# Altium footprint library 元件1.PcbLib: 420 footprints (part 15 of 27)
Each footprint in its own frame and in the unit in brackets; x right, y up, seen from the top. Pads: shape width x height; smd on the part's side, far side on the other; paste and mask are expansions set on the pad; w line width, h text height; cw(c..) or ccw(c..) is an arc to the next point about the centre after c.
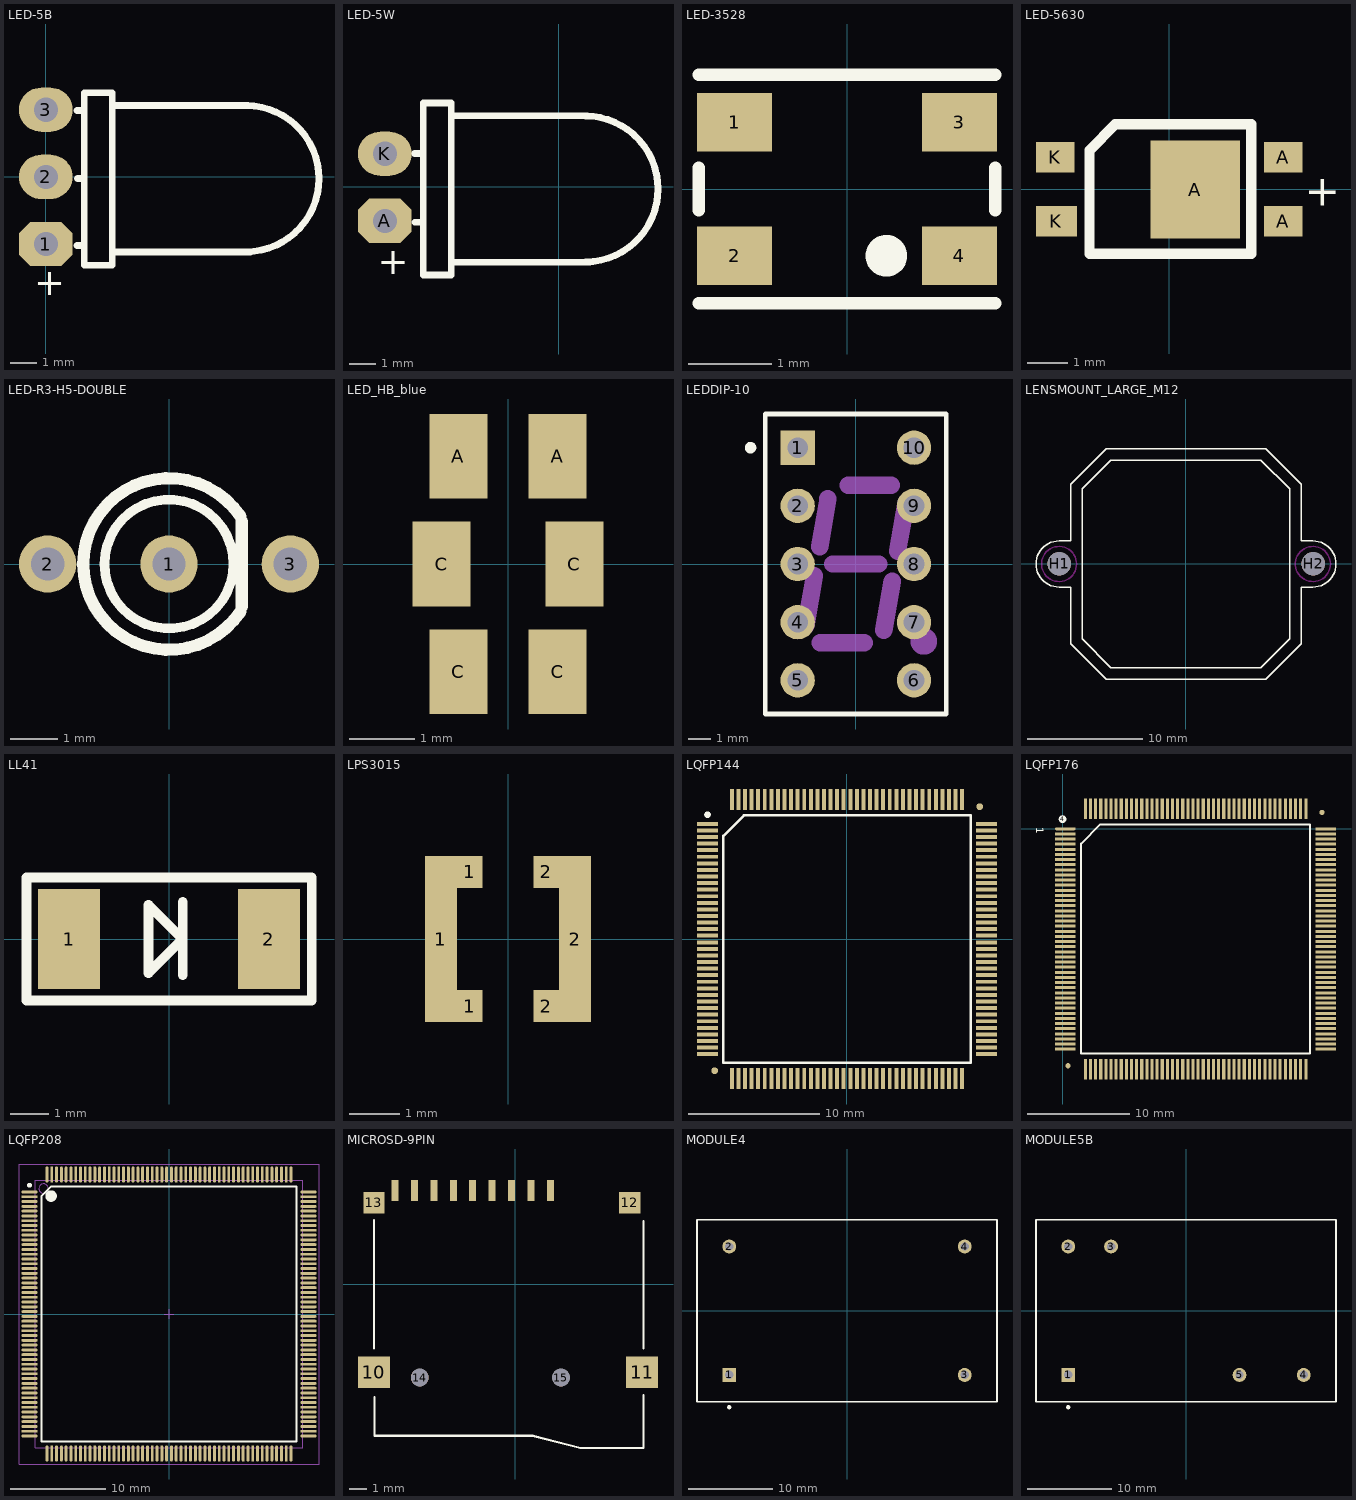
[diagram p14: the footprints below, top view; thin cyan lines are the x and y axes]

## LED-5B [mm]
pads (3):
  oct 2x1.651 hole 0.9 mask+0.03: 1(0,-2.502)
  oval 2x1.651 hole 0.9 mask+0.03: 2(0,0) 3(0,2.502)
Top Overlay:
  lines w0.254: 1.164,-2.551 1.393,-2.551 ; 1.164,2.478 1.393,2.478 ; 1.177,-0.062 1.406,-0.062 ; 2.472,-2.798 7.629,-2.798 ; 2.549,2.663 7.527,2.663 ; 7.477,-2.788 ccw(c7.454,-0.066) 7.476,2.656 ; 1.431,-3.294 2.472,-3.294 2.472,3.132 1.431,3.132 1.431,-3.294
  text "+" at -0.423,-4.405 h1
3D body "LED5-BW.STEP": height 0.87, standoff -7.2, extent -0.415,-3.115 11.108,2.884

## LED-5W [mm]
pads (2):
  oct 2x1.651 hole 0.9 mask+0.03: A(-6.486,-1.271)
  oval 2x1.651 hole 0.9 mask+0.03: K(-6.486,1.23)
Top Overlay:
  lines w0.254: -5.385,1.245 -5.055,1.245 ; -5.359,-1.321 -5.105,-1.321 ; -4.013,-2.813 1.143,-2.813 ; -3.937,2.648 1.041,2.648 ; 0.991,-2.802 ccw(c0.969,-0.08) 0.991,2.642 ; -5.055,-3.283 -4.013,-3.283 -4.013,3.117 -5.055,3.117 -5.055,-3.283
  text "+" at -6.756,-3.251 h1
3D body "LED5-H.STEP": height 6, standoff -2.07, extent -6.849,-3.073 4.674,2.927

## LED-3528 [mm]
pads (4):
  rect 0.9x0.7 smd: 1(-1.35,0.8) 2(-1.35,-0.8) 3(1.35,0.8) 4(1.35,-0.8)
Top Overlay:
  circle w0.25: c0.472,-0.802 r0.125
  lines w0.152: -1.778,-1.372 1.778,-1.372 ; -1.778,-0.254 -1.778,0.254 ; -1.778,1.372 1.778,1.372 ; 1.778,-0.254 1.778,0.254
3D body "LED-3528.STEP": height 1.95, standoff 0, extent -1.747,-1.379 1.754,1.371

## LED-5630 [mm]
pads (5):
  rect 2.2x2.4 smd: A(0.635,-0.006)
  rect 0.95x0.75 smd: A(2.794,-0.781) A(2.794,0.781) K(-2.794,0.781)
  rect 1x0.75 smd: K(-2.769,-0.781)
Top Overlay:
  lines w0.254: -1.956,-1.581 -1.956,0.959 -1.321,1.594 2.007,1.594 2.007,-1.581 -1.956,-1.581
  text "+" at 3.327,-0.4 h0.76
3D body "User Library-5630.step": height 0.95, standoff -0.01, extent -2.775,-1.457 2.826,1.543

## LED-R3-H5-DOUBLE [mm]
height 5
pads (3):
  round 1.2 hole 0.7: 1(0,0) 2(-2.54,0) 3(2.54,0)
Top Overlay:
  circle w0.2: c0,0 r1.35
  lines w0.254: 1.494,-0.996 cw(c0,0) 1.494,0.996 ; 1.524,-0.889 1.524,0.889
3D body "LED-DBL.STEP": height 5.7, standoff -2.3, extent -2.79,-2.035 2.79,2.035

## LED_HB_blue [mil] "LED High Brightness for blue"
pads (6):
  rect 35x51 smd: A(-30,65) A(30,65) C(-40,0) C(-30,-65) C(30,-65) C(40,0)
3D body "User Library-LED_ASMT-QTB0-0AA02.STEP": height 76.77, standoff -1.97, extent -67.32,-69.29 66.54,72.44

## LEDDIP-10 [mm] "LED, 7-Segment Display, 7.62 mm, RHD; 10 Leads; Row Space 5.08 mm; Pitch 2.54 mm"
height 6.34
pads (10):
  rect 1.5x1.5 hole 0.9: 1(-2.54,5.08)
  round 1.5 hole 0.9: 2(-2.54,2.54) 3(-2.54,0) 4(-2.54,-2.54) 5(-2.54,-5.08) 6(2.54,-5.08) 7(2.54,-2.54) 8(2.54,0) 9(2.54,2.54) 10(2.54,5.08)
Top Overlay:
  circle w0.25: c-4.6,5.08 r0.125
  lines w0.2: -3.95,-6.55 3.95,-6.55 3.95,6.55 -3.95,6.55 -3.95,-6.55
Mechanical 1:
  circle w0.86: c2.97,-3.38 r0.15
  lines w0.762: -2.19,-2.69 -1.81,-0.52 ; -1.58,0.76 -1.22,2.84 ; -1.56,-3.43 0.36,-3.43 ; -1.004,0 1.004,0 ; -0.34,3.43 1.55,3.43 ; 1.22,-2.89 1.59,-0.76 ; 1.82,0.56 2.2,2.69
3D body "LEDDIP-10.STEP": height 6, standoff 0, extent -4.025,-6.447 3.975,6.553

## LENSMOUNT_LARGE_M12 [mil]
pads (2):
  round 80 hole 80: H1(-432.68,0.39) H2(433.86,0.79)
Top Overlay:
  lines w5: -433.07,-78.74 cw(c-433.07,0) -433.07,78.74 -393.7,78.74 -393.7,271.66 -271.65,393.7 271.65,393.7 393.71,271.66 393.71,78.74 433.08,78.74 cw(c433.08,0) 433.08,-78.74 393.71,-78.74 393.71,-271.65 271.65,-393.7 -271.65,-393.7 -393.7,-271.65 -393.7,-78.74 -433.07,-78.74 ; -354.33,-255.91 -255.91,-354.33 255.91,-354.33 354.34,-255.91 354.34,255.91 255.91,354.33 -255.91,354.33 -354.33,255.91 -354.33,-255.91
Keep-Out Layer:
  circle w5: c433.07,0 r60
  circle w5: c-433.07,0 r60
3D body "LENS_MOUNT.STEP": height 511.81, standoff 0, extent -512.99,-395.28 518.5,392.13

## LL41 [mm] "DO-213AB/LL35"
pads (2):
  rect 1.6x2.6 smd: 1(-2.6,0) 2(2.6,0)
Top Overlay:
  lines w0.254: 0.356,-0.94 0.356,0.965 ; -3.708,-1.6 3.709,-1.6 3.709,1.6 -3.708,1.6 -3.708,-1.6 ; -0.533,-0.889 0.356,0 -0.533,0.889 -0.533,-0.889
3D body "MELF DO-213AB.step": height 2.67, standoff 0, extent -2.6,-1.332 2.6,1.332

## LPS3015 [mil] "INDUCTOR 2.2UH"
pads (6):
  rect 25x130 smd: 1(-52.5,0) 2(52.5,0)
  rect 20x25 smd: 1(-30,-52.5) 1(-30,52.5) 2(30,-52.5) 2(30,52.5)
3D body "Coilcraft-LPS3015-DEFAULT.STEP": height -15.75, standoff -74.8, extent -61.73,-61.65 62.52,62.6

## LQFP144 [mm]
pads (146):
  rect 1.6x0.3 smd: 1(-10.6,8.75) 2(-10.6,8.25) 3(-10.6,7.75) 4(-10.6,7.25) 5(-10.6,6.75) 6(-10.6,6.25) 7(-10.6,5.75) 8(-10.6,5.25) 9(-10.6,4.75) 10(-10.6,4.25) 11(-10.6,3.75) 12(-10.6,3.25) 13(-10.6,2.75) 14(-10.6,2.25) 15(-10.6,1.75) 16(-10.6,1.25) 17(-10.6,0.75) 18(-10.6,0.25) 19(-10.6,-0.25) 20(-10.6,-0.75) 21(-10.6,-1.25) 22(-10.6,-1.75) 23(-10.6,-2.25) 24(-10.6,-2.75) 25(-10.6,-3.25) 26(-10.6,-3.75) 27(-10.6,-4.25) 28(-10.6,-4.75) 29(-10.6,-5.25) 30(-10.6,-5.75) 31(-10.6,-6.25) 32(-10.6,-6.75) 33(-10.6,-7.25) 34(-10.6,-7.75) 35(-10.6,-8.25) 36(-10.6,-8.75) 73(10.6,-8.75) 74(10.6,-8.25) 75(10.6,-7.75) 76(10.6,-7.25) 77(10.6,-6.75) 78(10.6,-6.25) 79(10.6,-5.75) 80(10.6,-5.25) 81(10.6,-4.75) 82(10.6,-4.25) 83(10.6,-3.75) 84(10.6,-3.25) 85(10.6,-2.75) 86(10.6,-2.25) 87(10.6,-1.75) 88(10.6,-1.25) 89(10.6,-0.75) 90(10.6,-0.25) 91(10.6,0.25) 92(10.6,0.75) 93(10.6,1.25) 94(10.6,1.75) 95(10.6,2.25) 96(10.6,2.75) 97(10.6,3.25) 98(10.6,3.75) 99(10.6,4.25) 100(10.6,4.75) 101(10.6,5.25) 102(10.6,5.75) 103(10.6,6.25) 104(10.6,6.75) 105(10.6,7.25) 106(10.6,7.75) 107(10.6,8.25) 108(10.6,8.75)
  round 0.508 smd: 6(10.084,10.058) 7(-10.058,-10.008)
  rect 0.3x1.6 smd: 37(-8.75,-10.6) 38(-8.25,-10.6) 39(-7.75,-10.6) 40(-7.25,-10.6) 41(-6.75,-10.6) 42(-6.25,-10.6) 43(-5.75,-10.6) 44(-5.25,-10.6) 45(-4.75,-10.6) 46(-4.25,-10.6) 47(-3.75,-10.6) 48(-3.25,-10.6) 49(-2.75,-10.6) 50(-2.25,-10.6) 51(-1.75,-10.6) 52(-1.25,-10.6) 53(-0.75,-10.6) 54(-0.25,-10.6) 55(0.25,-10.6) 56(0.75,-10.6) 57(1.25,-10.6) 58(1.75,-10.6) 59(2.25,-10.6) 60(2.75,-10.6) 61(3.25,-10.6) 62(3.75,-10.6) 63(4.25,-10.6) 64(4.75,-10.6) 65(5.25,-10.6) 66(5.75,-10.6) 67(6.25,-10.6) 68(6.75,-10.6) 69(7.25,-10.6) 70(7.75,-10.6) 71(8.25,-10.6) 72(8.75,-10.6) 109(8.75,10.6) 110(8.25,10.6) 111(7.75,10.6) 112(7.25,10.6) 113(6.75,10.6) 114(6.25,10.6) 115(5.75,10.6) 116(5.25,10.6) 117(4.75,10.6) 118(4.25,10.6) 119(3.75,10.6) 120(3.25,10.6) 121(2.75,10.6) 122(2.25,10.6) 123(1.75,10.6) 124(1.25,10.6) 125(0.75,10.6) 126(0.25,10.6) 127(-0.25,10.6) 128(-0.75,10.6) 129(-1.25,10.6) 130(-1.75,10.6) 131(-2.25,10.6) 132(-2.75,10.6) 133(-3.25,10.6) 134(-3.75,10.6) 135(-4.25,10.6) 136(-4.75,10.6) 137(-5.25,10.6) 138(-5.75,10.6) 139(-6.25,10.6) 140(-6.75,10.6) 141(-7.25,10.6) 142(-7.75,10.6) 143(-8.25,10.6) 144(-8.75,10.6)
Top Overlay:
  circle w0.25: c-10.6,9.45 r0.125
  lines w0.2: -9.4,-9.4 -9.4,7.847 -7.847,9.4 9.4,9.4 9.4,-9.4 -9.4,-9.4
3D body "TQFP144.STEP": height 1.1, standoff 0, extent -10.983,-11.009 11.034,11.009

## LQFP176 [mm]
pads (179):
  oval 2x0.3 smd: 1(0.254,0)
  rect 2x0.3 smd: 2(0.254,-0.5) 3(0.254,-1) 4(0.254,-1.5) 5(0.254,-2) 6(0.254,-2.5) 7(0.254,-3) 8(0.254,-3.5) 9(0.254,-4) 10(0.254,-4.5) 11(0.254,-5) 12(0.254,-5.5) 13(0.254,-6) 14(0.254,-6.5) 15(0.254,-7) 16(0.254,-7.5) 17(0.254,-8) 18(0.254,-8.5) 19(0.254,-9) 20(0.254,-9.5) 21(0.254,-10) 22(0.254,-10.5) 23(0.254,-11) 24(0.254,-11.5) 25(0.254,-12) 26(0.254,-12.5) 27(0.254,-13) 28(0.254,-13.5) 29(0.254,-14) 30(0.254,-14.5) 31(0.254,-15) 32(0.254,-15.5) 33(0.254,-16) 34(0.254,-16.5) 35(0.254,-17) 36(0.254,-17.5) 37(0.254,-18) 38(0.254,-18.5) 39(0.254,-19) 40(0.254,-19.5) 41(0.254,-20) 42(0.254,-20.5) 43(0.254,-21) 44(0.254,-21.5) 89(25.646,-21.5) 90(25.646,-21) 91(25.646,-20.5) 92(25.646,-20) 93(25.646,-19.5) 94(25.646,-19) 95(25.646,-18.5) 96(25.646,-18) 97(25.646,-17.5) 98(25.646,-17) 99(25.646,-16.5) 100(25.646,-16) 101(25.646,-15.5) 102(25.646,-15) 103(25.646,-14.5) 104(25.646,-14) 105(25.646,-13.5) 106(25.646,-13) 107(25.646,-12.5) 108(25.646,-12) 109(25.646,-11.5) 110(25.646,-11) 111(25.646,-10.5) 112(25.646,-10) 113(25.646,-9.5) 114(25.646,-9) 115(25.646,-8.5) 116(25.646,-8) 117(25.646,-7.5) 118(25.646,-7) 119(25.646,-6.5) 120(25.646,-6) 121(25.646,-5.5) 122(25.646,-5) 123(25.646,-4.5) 124(25.646,-4) 125(25.646,-3.5) 126(25.646,-3) 127(25.646,-2.5) 128(25.646,-2) 129(25.646,-1.5) 130(25.646,-1) 131(25.646,-0.5) 132(25.646,0)
  round 0.508 smd: 2(25.273,1.6) 3(0.508,-23.114)
  round 0.762 on Top Overlay: 4(-0.025,0.94)
  rect 0.3x2 smd: 45(2.2,-23.446) 46(2.7,-23.446) 47(3.2,-23.446) 48(3.7,-23.446) 49(4.2,-23.446) 50(4.7,-23.446) 51(5.2,-23.446) 52(5.7,-23.446) 53(6.2,-23.446) 54(6.7,-23.446) 55(7.2,-23.446) 56(7.7,-23.446) 57(8.2,-23.446) 58(8.7,-23.446) 59(9.2,-23.446) 60(9.7,-23.446) 61(10.2,-23.446) 62(10.7,-23.446) 63(11.2,-23.446) 64(11.7,-23.446) 65(12.2,-23.446) 66(12.7,-23.446) 67(13.2,-23.446) 68(13.7,-23.446) 69(14.2,-23.446) 70(14.7,-23.446) 71(15.2,-23.446) 72(15.7,-23.446) 73(16.2,-23.446) 74(16.7,-23.446) 75(17.2,-23.446) 76(17.7,-23.446) 77(18.2,-23.446) 78(18.7,-23.446) 79(19.2,-23.446) 80(19.7,-23.446) 81(20.2,-23.446) 82(20.7,-23.446) 83(21.2,-23.446) 84(21.7,-23.446) 85(22.2,-23.446) 86(22.7,-23.446) 87(23.2,-23.446) 88(23.7,-23.446) 133(23.7,1.946) 134(23.2,1.946) 135(22.7,1.946) 136(22.2,1.946) 137(21.7,1.946) 138(21.2,1.946) 139(20.7,1.946) 140(20.2,1.946) 141(19.7,1.946) 142(19.2,1.946) 143(18.7,1.946) 144(18.2,1.946) 145(17.7,1.946) 146(17.2,1.946) 147(16.7,1.946) 148(16.2,1.946) 149(15.7,1.946) 150(15.2,1.946) 151(14.7,1.946) 152(14.2,1.946) 153(13.7,1.946) 154(13.2,1.946) 155(12.7,1.946) 156(12.2,1.946) 157(11.7,1.946) 158(11.2,1.946) 159(10.7,1.946) 160(10.2,1.946) 161(9.7,1.946) 162(9.2,1.946) 163(8.7,1.946) 164(8.2,1.946) 165(7.7,1.946) 166(7.2,1.946) 167(6.7,1.946) 168(6.2,1.946) 169(5.7,1.946) 170(5.2,1.946) 171(4.7,1.946) 172(4.2,1.946) 173(3.7,1.946) 174(3.2,1.946) 175(2.7,1.946) 176(2.2,1.946)
Top Overlay:
  lines w0.2: 24.079,0.432 3.658,0.432 1.785,-1.441 1.785,-21.915 24.115,-21.915 24.115,0.415
  text "1" at -2.616,0.127 h0.76
3D body "TQFP176.STEP": height 1.1, standoff 0, extent -0.055,-23.753 25.963,2.265

## LQFP208 [mm] "TSQFP, 208-Leads, Body 28.00x28.00mm, Pitch 0.50mm, IPC Medium Density"
height 1.6
pads (208):
  oval 1.7x0.3 smd: 1(-14.575,12.75) 2(-14.575,12.25) 3(-14.575,11.75) 4(-14.575,11.25) 5(-14.575,10.75) 6(-14.575,10.25) 7(-14.575,9.75) 8(-14.575,9.25) 9(-14.575,8.75) 10(-14.575,8.25) 11(-14.575,7.75) 12(-14.575,7.25) 13(-14.575,6.75) 14(-14.575,6.25) 15(-14.575,5.75) 16(-14.575,5.25) 17(-14.575,4.75) 18(-14.575,4.25) 19(-14.575,3.75) 20(-14.575,3.25) 21(-14.575,2.75) 22(-14.575,2.25) 23(-14.575,1.75) 24(-14.575,1.25) 25(-14.575,0.75) 26(-14.575,0.25) 27(-14.575,-0.25) 28(-14.575,-0.75) 29(-14.575,-1.25) 30(-14.575,-1.75) 31(-14.575,-2.25) 32(-14.575,-2.75) 33(-14.575,-3.25) 34(-14.575,-3.75) 35(-14.575,-4.25) 36(-14.575,-4.75) 37(-14.575,-5.25) 38(-14.575,-5.75) 39(-14.575,-6.25) 40(-14.575,-6.75) 41(-14.575,-7.25) 42(-14.575,-7.75) 43(-14.575,-8.25) 44(-14.575,-8.75) 45(-14.575,-9.25) 46(-14.575,-9.75) 47(-14.575,-10.25) 48(-14.575,-10.75) 49(-14.575,-11.25) 50(-14.575,-11.75) 51(-14.575,-12.25) 52(-14.575,-12.75) 105(14.575,-12.75) 106(14.575,-12.25) 107(14.575,-11.75) 108(14.575,-11.25) 109(14.575,-10.75) 110(14.575,-10.25) 111(14.575,-9.75) 112(14.575,-9.25) 113(14.575,-8.75) 114(14.575,-8.25) 115(14.575,-7.75) 116(14.575,-7.25) 117(14.575,-6.75) 118(14.575,-6.25) 119(14.575,-5.75) 120(14.575,-5.25) 121(14.575,-4.75) 122(14.575,-4.25) 123(14.575,-3.75) 124(14.575,-3.25) 125(14.575,-2.75) 126(14.575,-2.25) 127(14.575,-1.75) 128(14.575,-1.25) 129(14.575,-0.75) 130(14.575,-0.25) 131(14.575,0.25) 132(14.575,0.75) 133(14.575,1.25) 134(14.575,1.75) 135(14.575,2.25) 136(14.575,2.75) 137(14.575,3.25) 138(14.575,3.75) 139(14.575,4.25) 140(14.575,4.75) 141(14.575,5.25) 142(14.575,5.75) 143(14.575,6.25) 144(14.575,6.75) 145(14.575,7.25) 146(14.575,7.75) 147(14.575,8.25) 148(14.575,8.75) 149(14.575,9.25) 150(14.575,9.75) 151(14.575,10.25) 152(14.575,10.75) 153(14.575,11.25) 154(14.575,11.75) 155(14.575,12.25) 156(14.575,12.75)
  oval 0.3x1.7 smd: 53(-12.75,-14.575) 54(-12.25,-14.575) 55(-11.75,-14.575) 56(-11.25,-14.575) 57(-10.75,-14.575) 58(-10.25,-14.575) 59(-9.75,-14.575) 60(-9.25,-14.575) 61(-8.75,-14.575) 62(-8.25,-14.575) 63(-7.75,-14.575) 64(-7.25,-14.575) 65(-6.75,-14.575) 66(-6.25,-14.575) 67(-5.75,-14.575) 68(-5.25,-14.575) 69(-4.75,-14.575) 70(-4.25,-14.575) 71(-3.75,-14.575) 72(-3.25,-14.575) 73(-2.75,-14.575) 74(-2.25,-14.575) 75(-1.75,-14.575) 76(-1.25,-14.575) 77(-0.75,-14.575) 78(-0.25,-14.575) 79(0.25,-14.575) 80(0.75,-14.575) 81(1.25,-14.575) 82(1.75,-14.575) 83(2.25,-14.575) 84(2.75,-14.575) 85(3.25,-14.575) 86(3.75,-14.575) 87(4.25,-14.575) 88(4.75,-14.575) 89(5.25,-14.575) 90(5.75,-14.575) 91(6.25,-14.575) 92(6.75,-14.575) 93(7.25,-14.575) 94(7.75,-14.575) 95(8.25,-14.575) 96(8.75,-14.575) 97(9.25,-14.575) 98(9.75,-14.575) 99(10.25,-14.575) 100(10.75,-14.575) 101(11.25,-14.575) 102(11.75,-14.575) 103(12.25,-14.575) 104(12.75,-14.575) 157(12.75,14.575) 158(12.25,14.575) 159(11.75,14.575) 160(11.25,14.575) 161(10.75,14.575) 162(10.25,14.575) 163(9.75,14.575) 164(9.25,14.575) 165(8.75,14.575) 166(8.25,14.575) 167(7.75,14.575) 168(7.25,14.575) 169(6.75,14.575) 170(6.25,14.575) 171(5.75,14.575) 172(5.25,14.575) 173(4.75,14.575) 174(4.25,14.575) 175(3.75,14.575) 176(3.25,14.575) 177(2.75,14.575) 178(2.25,14.575) 179(1.75,14.575) 180(1.25,14.575) 181(0.75,14.575) 182(0.25,14.575) 183(-0.25,14.575) 184(-0.75,14.575) 185(-1.25,14.575) 186(-1.75,14.575) 187(-2.25,14.575) 188(-2.75,14.575) 189(-3.25,14.575) 190(-3.75,14.575) 191(-4.25,14.575) 192(-4.75,14.575) 193(-5.25,14.575) 194(-5.75,14.575) 195(-6.25,14.575) 196(-6.75,14.575) 197(-7.25,14.575) 198(-7.75,14.575) 199(-8.25,14.575) 200(-8.75,14.575) 201(-9.25,14.575) 202(-9.75,14.575) 203(-10.25,14.575) 204(-10.75,14.575) 205(-11.25,14.575) 206(-11.75,14.575) 207(-12.25,14.575) 208(-12.75,14.575)
Top Overlay:
  circle w0.6: c-12.325,12.325 r0.3
  circle w0.25: c-14.575,13.45 r0.125
  lines w0.2: -13.325,-13.325 -13.325,12.329 -12.329,13.325 13.325,13.325 13.325,-13.325 -13.325,-13.325
Mechanical 13:
  circle w0.1: c-13.1,13.1 r0.5
  lines w0.1: -14,-14 14,-14 14,14 -14,14 -14,-14
Mechanical 15:
  lines w0.05: -15.675,-15.675 15.675,-15.675 15.675,15.675 -15.675,15.675 -15.675,-15.675
  lines w0.1: -0.5,0 0.5,0 ; 0,-0.5 0,0.5
3D body "PQ208.STEP": height 4.15, standoff -0.08, extent -15.309,-15.249 15.291,15.351

## MICROSD-9PIN [mm] "9 PIN MICRO SD HEADER"
pads (15):
  rect 0.4x1.2 smd: 1(2,5.3) 2(0.9,5.3) 3(-0.2,5.3) 4(-1.3,5.3) 5(-2.4,5.3) 6(-3.5,5.3) 7(-4.6,5.3) 8(-5.7,5.3) 9(-6.8,5.3)
  rect 1.8x1.8 smd: 10(-8,-5)
  rect 1.8x1.8 smd mask+0.102: 11(7.2,-5)
  rect 1.2x1.2 smd mask+0.102: 12(6.5,4.6) 13(-8,4.6)
  round 1 hole 1: 14(-5.4,-5.3) 15(2.6,-5.3)
Top Overlay:
  lines w0.128: -8,-3.66 -8,3.62 ; -7.96,-6.41 -7.96,-8.6 -3.06,-8.6 1,-8.6 3.7,-9.3 7.28,-9.3 7.28,-6.31 ; 7.28,-3.66 7.28,3.57
3D body "User Library-Micro SD.STEP": height 2.07, standoff -0.4, extent -8.453,-9.27 7.853,5.94

## MODULE4 [mm] "DIP; 4 Round Pins; Row Space 27.94 mm; Pitch 15.24 mm"
height 14
pads (4):
  rect 1.65x1.65 hole 1: 1(-13.97,-7.62)
  round 1.65 hole 1: 2(-13.97,7.62) 3(13.97,-7.62) 4(13.97,7.62)
Top Overlay:
  circle w0.25: c-13.97,-11.45 r0.125
  lines w0.2: -17.8,-10.8 17.8,-10.8 17.8,10.8 -17.8,10.8 -17.8,-10.8
3D body "MODULE4.STEP": height 10, standoff 0, extent -17.474,-10.424 17.526,10.576

## MODULE5B [mm] "DIP; 5 Round Pins; Row Space 15.24 mm; Pitch 2.54 mm"
height 14
pads (5):
  rect 1.65x1.65 hole 1: 1(-13.97,-7.62)
  round 1.65 hole 1: 2(-13.97,7.62) 3(-8.89,7.62) 4(13.97,-7.62) 5(6.35,-7.62)
Top Overlay:
  circle w0.25: c-13.97,-11.45 r0.125
  lines w0.2: -17.8,-10.8 -17.8,10.8 17.8,10.8 17.8,-10.8 -17.8,-10.8
3D body "MODULE4.STEP": height 10, standoff 0, extent -17.55,-10.525 17.45,10.475